# Altium schematic symbol library jlcpcb_2025_04_capacitors_extended_1206.schlib: 2503 symbols (part 5 of 14) (continued)
## C3216X5R1C476MTJ00N
designator C?  Capacitance: 47uF  (hidden comment: *)
Capacitor, Ceramic (MLCC), 47uF, ±20%, 16V, X5R, ±20%, SMD 1206; Manufacturer: TDK; Manufacturer Part Number: C3216X5R1C476MTJ00N; Package Size: 1206; JLCPCB Basic Part: No; JLCPCB Part Number: C338051; Supplier 1: LCSC; Category: Capacitors - MLCC; Supplier Part Number 1: C338051; Tolerance: ±20%; Voltage Rating: 16V; Temperature Coefficient: X5R; RoHS: Yes; ComponentLink1Description: Datasheet; ComponentLink1URL: https://wmsc.lcsc.com/wmsc/upload/file/pdf/v2/lcsc/2304140030_TDK-C3216X5R1C476MTJ00N_C338051.pdf; ComponentLink2Description: JLCPCB Part URL; ComponentLink2URL: https://jlcpcb.com/partdetail/C338051; ComponentLink3Description: LCSC Part URL; ComponentLink3URL: https://lcsc.com/product-detail/Multilayer-Ceramic-Capacitors-MLCC---SMD-SMT_TDK-TDK-C3216X5R1C476MTJ00N_C338051.html
footprint CAP-1206 (1206 (3216M) Capacitor)
pins: 1, 2

## C3216X5R1E106KT000E
designator C?  Capacitance: 10uF  (hidden comment: *)
Capacitor, Ceramic (MLCC), 10uF, ±10%, 25V, X5R, ±10%, SMD 1206; Manufacturer: TDK; Manufacturer Part Number: C3216X5R1E106KT000E; Package Size: 1206; JLCPCB Basic Part: No; JLCPCB Part Number: C329929; Supplier 1: LCSC; Category: Capacitors - MLCC; Supplier Part Number 1: C329929; Tolerance: ±10%; Voltage Rating: 25V; Temperature Coefficient: X5R; RoHS: Yes; ComponentLink1Description: Datasheet; ComponentLink1URL: https://wmsc.lcsc.com/wmsc/upload/file/pdf/v2/lcsc/2304140030_TDK-C3216X5R1E106KT000E_C329929.pdf; ComponentLink2Description: JLCPCB Part URL; ComponentLink2URL: https://jlcpcb.com/partdetail/C329929; ComponentLink3Description: LCSC Part URL; ComponentLink3URL: https://lcsc.com/product-detail/Multilayer-Ceramic-Capacitors-MLCC---SMD-SMT_TDK-TDK-C3216X5R1E106KT000E_C329929.html
footprint CAP-1206 (1206 (3216M) Capacitor)
pins: 1, 2

## C3216X5R1E106MT000N
designator C?  Capacitance: 10uF  (hidden comment: *)
Capacitor, Ceramic (MLCC), 10uF, ±20%, 25V, X5R, ±20%, SMD 1206; Manufacturer: TDK; Manufacturer Part Number: C3216X5R1E106MT000N; Package Size: 1206; JLCPCB Basic Part: No; JLCPCB Part Number: C342843; Supplier 1: LCSC; Category: Capacitors - MLCC; Supplier Part Number 1: C342843; Tolerance: ±20%; Voltage Rating: 25V; Temperature Coefficient: X5R; RoHS: Yes; ComponentLink1Description: Datasheet; ComponentLink1URL: https://wmsc.lcsc.com/wmsc/upload/file/pdf/v2/lcsc/2304140030_TDK-C3216X5R1E106MT000N_C342843.pdf; ComponentLink2Description: JLCPCB Part URL; ComponentLink2URL: https://jlcpcb.com/partdetail/C342843; ComponentLink3Description: LCSC Part URL; ComponentLink3URL: https://lcsc.com/product-detail/Multilayer-Ceramic-Capacitors-MLCC---SMD-SMT_TDK-TDK-C3216X5R1E106MT000N_C342843.html
footprint CAP-1206 (1206 (3216M) Capacitor)
pins: 1, 2

## C3216X5R1E226KTJ00N
designator C?  Capacitance: 22uF  (hidden comment: *)
Capacitor, Ceramic (MLCC), 22uF, ±10%, 25V, X5R, ±10%, SMD 1206; Manufacturer: TDK; Manufacturer Part Number: C3216X5R1E226KTJ00N; Package Size: 1206; JLCPCB Basic Part: No; JLCPCB Part Number: C338055; Supplier 1: LCSC; Category: Capacitors - MLCC; Supplier Part Number 1: C338055; Tolerance: ±10%; Voltage Rating: 25V; Temperature Coefficient: X5R; RoHS: Yes; ComponentLink1Description: Datasheet; ComponentLink1URL: https://wmsc.lcsc.com/wmsc/upload/file/pdf/v2/lcsc/2304140030_TDK-C3216X5R1E226KTJ00N_C338055.pdf; ComponentLink2Description: JLCPCB Part URL; ComponentLink2URL: https://jlcpcb.com/partdetail/C338055; ComponentLink3Description: LCSC Part URL; ComponentLink3URL: https://lcsc.com/product-detail/Multilayer-Ceramic-Capacitors-MLCC---SMD-SMT_TDK-TDK-C3216X5R1E226KTJ00N_C338055.html
footprint CAP-1206 (1206 (3216M) Capacitor)
pins: 1, 2

## C3216X5R1E226MTJ00N
designator C?  Capacitance: 22uF  (hidden comment: *)
Capacitor, Ceramic (MLCC), 22uF, ±20%, 25V, X5R, ±20%, SMD 1206; Manufacturer: TDK; Manufacturer Part Number: C3216X5R1E226MTJ00N; Package Size: 1206; JLCPCB Basic Part: No; JLCPCB Part Number: C361176; Supplier 1: LCSC; Category: Capacitors - MLCC; Supplier Part Number 1: C361176; Tolerance: ±20%; Voltage Rating: 25V; Temperature Coefficient: X5R; RoHS: Yes; ComponentLink1Description: Datasheet; ComponentLink1URL: https://wmsc.lcsc.com/wmsc/upload/file/pdf/v2/lcsc/2304140030_TDK-C3216X5R1E226MTJ00N_C361176.pdf; ComponentLink2Description: JLCPCB Part URL; ComponentLink2URL: https://jlcpcb.com/partdetail/C361176; ComponentLink3Description: LCSC Part URL; ComponentLink3URL: https://lcsc.com/product-detail/Multilayer-Ceramic-Capacitors-MLCC---SMD-SMT_TDK-TDK-C3216X5R1E226MTJ00N_C361176.html
footprint CAP-1206 (1206 (3216M) Capacitor)
pins: 1, 2

## C3216X5R1E336MT000E
designator C?  Capacitance: 33uF  (hidden comment: *)
Capacitor, Ceramic (MLCC), 33uF, ±20%, 25V, X5R, ±20%, SMD 1206; Manufacturer: TDK; Manufacturer Part Number: C3216X5R1E336MT000E; Package Size: 1206; JLCPCB Basic Part: No; JLCPCB Part Number: C342307; Supplier 1: LCSC; Category: Capacitors - MLCC; Supplier Part Number 1: C342307; Tolerance: ±20%; Voltage Rating: 25V; Temperature Coefficient: X5R; RoHS: Yes; ComponentLink1Description: Datasheet; ComponentLink1URL: https://wmsc.lcsc.com/wmsc/upload/file/pdf/v2/lcsc/2304140030_TDK-C3216X5R1E336MT000E_C342307.pdf; ComponentLink2Description: JLCPCB Part URL; ComponentLink2URL: https://jlcpcb.com/partdetail/C342307; ComponentLink3Description: LCSC Part URL; ComponentLink3URL: https://lcsc.com/product-detail/Multilayer-Ceramic-Capacitors-MLCC---SMD-SMT_TDK-TDK-C3216X5R1E336MT000E_C342307.html
footprint CAP-1206 (1206 (3216M) Capacitor)
pins: 1, 2

## C3216X5R1E475KT000N
designator C?  Capacitance: 4.7uF  (hidden comment: *)
Capacitor, Ceramic (MLCC), 4.7uF, ±10%, 25V, X5R, ±10%, SMD 1206; Manufacturer: TDK; Manufacturer Part Number: C3216X5R1E475KT000N; Package Size: 1206; JLCPCB Basic Part: No; JLCPCB Part Number: C338009; Supplier 1: LCSC; Category: Capacitors - MLCC; Supplier Part Number 1: C338009; Tolerance: ±10%; Voltage Rating: 25V; Temperature Coefficient: X5R; RoHS: Yes; ComponentLink1Description: Datasheet; ComponentLink1URL: https://wmsc.lcsc.com/wmsc/upload/file/pdf/v2/lcsc/2304140030_TDK-C3216X5R1E475KT000N_C338009.pdf; ComponentLink2Description: JLCPCB Part URL; ComponentLink2URL: https://jlcpcb.com/partdetail/C338009; ComponentLink3Description: LCSC Part URL; ComponentLink3URL: https://lcsc.com/product-detail/Multilayer-Ceramic-Capacitors-MLCC---SMD-SMT_TDK-TDK-C3216X5R1E475KT000N_C338009.html
footprint CAP-1206 (1206 (3216M) Capacitor)
pins: 1, 2

## C3216X5R1E476MTJ00E
designator C?  Capacitance: 47uF  (hidden comment: *)
Capacitor, Ceramic (MLCC), 47uF, ±20%, 25V, X5R, ±20%, SMD 1206; Manufacturer: TDK; Manufacturer Part Number: C3216X5R1E476MTJ00E; Package Size: 1206; JLCPCB Basic Part: No; JLCPCB Part Number: C76659; Supplier 1: LCSC; Category: Capacitors - MLCC; Supplier Part Number 1: C76659; Tolerance: ±20%; Voltage Rating: 25V; Temperature Coefficient: X5R; RoHS: Yes; ComponentLink1Description: Datasheet; ComponentLink1URL: https://wmsc.lcsc.com/wmsc/upload/file/pdf/v2/lcsc/2304140030_TDK-C3216X5R1E476MTJ00E_C76659.pdf; ComponentLink2Description: JLCPCB Part URL; ComponentLink2URL: https://jlcpcb.com/partdetail/C76659; ComponentLink3Description: LCSC Part URL; ComponentLink3URL: https://lcsc.com/product-detail/Multilayer-Ceramic-Capacitors-MLCC---SMD-SMT_TDK-TDK-C3216X5R1E476MTJ00E_C76659.html
footprint CAP-1206 (1206 (3216M) Capacitor)
pins: 1, 2

## C3216X5R1H106KT000N
designator C?  Capacitance: 10uF  (hidden comment: *)
Capacitor, Ceramic (MLCC), 10uF, ±10%, 50V, X5R, ±10%, SMD 1206; Manufacturer: TDK; Manufacturer Part Number: C3216X5R1H106KT000N; Package Size: 1206; JLCPCB Basic Part: No; JLCPCB Part Number: C329928; Supplier 1: LCSC; Category: Capacitors - MLCC; Supplier Part Number 1: C329928; Tolerance: ±10%; Voltage Rating: 50V; Temperature Coefficient: X5R; RoHS: Yes; ComponentLink1Description: Datasheet; ComponentLink1URL: https://wmsc.lcsc.com/wmsc/upload/file/pdf/v2/lcsc/2304140030_TDK-C3216X5R1H106KT000N_C329928.pdf; ComponentLink2Description: JLCPCB Part URL; ComponentLink2URL: https://jlcpcb.com/partdetail/C329928; ComponentLink3Description: LCSC Part URL; ComponentLink3URL: https://lcsc.com/product-detail/Multilayer-Ceramic-Capacitors-MLCC---SMD-SMT_TDK-TDK-C3216X5R1H106KT000N_C329928.html
footprint CAP-1206 (1206 (3216M) Capacitor)
pins: 1, 2

## C3216X5R1H475KT0J5N
designator C?  Capacitance: 4.7uF  (hidden comment: *)
Capacitor, Ceramic (MLCC), 4.7uF, ±10%, 50V, X5R, ±10%, SMD 1206; Manufacturer: TDK; Manufacturer Part Number: C3216X5R1H475KT0J5N; Package Size: 1206; JLCPCB Basic Part: No; JLCPCB Part Number: C695152; Supplier 1: LCSC; Category: Capacitors - MLCC; Supplier Part Number 1: C695152; Tolerance: ±10%; Voltage Rating: 50V; Temperature Coefficient: X5R; RoHS: Yes; ComponentLink1Description: Datasheet; ComponentLink1URL: https://wmsc.lcsc.com/wmsc/upload/file/pdf/v2/lcsc/2304140030_TDK-C3216X5R1H475KT0J5N_C695152.pdf; ComponentLink2Description: JLCPCB Part URL; ComponentLink2URL: https://jlcpcb.com/partdetail/C695152; ComponentLink3Description: LCSC Part URL; ComponentLink3URL: https://lcsc.com/product-detail/Multilayer-Ceramic-Capacitors-MLCC---SMD-SMT_TDK-TDK-C3216X5R1H475KT0J5N_C695152.html
footprint CAP-1206 (1206 (3216M) Capacitor)
pins: 1, 2

## C3216X5R1H685KT000N
designator C?  Capacitance: 6.8uF  (hidden comment: *)
Capacitor, Ceramic (MLCC), 6.8uF, ±10%, 50V, X5R, ±10%, SMD 1206; Manufacturer: TDK; Manufacturer Part Number: C3216X5R1H685KT000N; Package Size: 1206; JLCPCB Basic Part: No; JLCPCB Part Number: C342643; Supplier 1: LCSC; Category: Capacitors - MLCC; Supplier Part Number 1: C342643; Tolerance: ±10%; Voltage Rating: 50V; Temperature Coefficient: X5R; RoHS: Yes; ComponentLink1Description: Datasheet; ComponentLink1URL: https://wmsc.lcsc.com/wmsc/upload/file/pdf/v2/lcsc/2304140030_TDK-C3216X5R1H685KT000N_C342643.pdf; ComponentLink2Description: JLCPCB Part URL; ComponentLink2URL: https://jlcpcb.com/partdetail/C342643; ComponentLink3Description: LCSC Part URL; ComponentLink3URL: https://lcsc.com/product-detail/Multilayer-Ceramic-Capacitors-MLCC---SMD-SMT_TDK-TDK-C3216X5R1H685KT000N_C342643.html
footprint CAP-1206 (1206 (3216M) Capacitor)
pins: 1, 2

## C3216X5R1V226MTJ00E
designator C?  Capacitance: 22uF  (hidden comment: *)
Capacitor, Ceramic (MLCC), 22uF, ±20%, 35V, X5R, ±20%, SMD 1206; Manufacturer: TDK; Manufacturer Part Number: C3216X5R1V226MTJ00E; Package Size: 1206; JLCPCB Basic Part: No; JLCPCB Part Number: C342620; Supplier 1: LCSC; Category: Capacitors - MLCC; Supplier Part Number 1: C342620; Tolerance: ±20%; Voltage Rating: 35V; Temperature Coefficient: X5R; RoHS: Yes; ComponentLink1Description: Datasheet; ComponentLink1URL: https://wmsc.lcsc.com/wmsc/upload/file/pdf/v2/lcsc/2304140030_TDK-C3216X5R1V226MTJ00E_C342620.pdf; ComponentLink2Description: JLCPCB Part URL; ComponentLink2URL: https://jlcpcb.com/partdetail/C342620; ComponentLink3Description: LCSC Part URL; ComponentLink3URL: https://lcsc.com/product-detail/Multilayer-Ceramic-Capacitors-MLCC---SMD-SMT_TDK-TDK-C3216X5R1V226MTJ00E_C342620.html
footprint CAP-1206 (1206 (3216M) Capacitor)
pins: 1, 2

## C3216X6S0J476MTJ00N
designator C?  Capacitance: 47uF  (hidden comment: *)
Capacitor, Ceramic (MLCC), 47uF, ±20%, 6.3V, X6S, ±20%, SMD 1206; Manufacturer: TDK; Manufacturer Part Number: C3216X6S0J476MTJ00N; Package Size: 1206; JLCPCB Basic Part: No; JLCPCB Part Number: C342598; Supplier 1: LCSC; Category: Capacitors - MLCC; Supplier Part Number 1: C342598; Tolerance: ±20%; Voltage Rating: 6.3V; Temperature Coefficient: X6S; RoHS: Yes; ComponentLink1Description: Datasheet; ComponentLink1URL: https://wmsc.lcsc.com/wmsc/upload/file/pdf/v2/lcsc/2304140030_TDK-C3216X6S0J476MTJ00N_C342598.pdf; ComponentLink2Description: JLCPCB Part URL; ComponentLink2URL: https://jlcpcb.com/partdetail/C342598; ComponentLink3Description: LCSC Part URL; ComponentLink3URL: https://lcsc.com/product-detail/Multilayer-Ceramic-Capacitors-MLCC---SMD-SMT_TDK-TDK-C3216X6S0J476MTJ00N_C342598.html
footprint CAP-1206 (1206 (3216M) Capacitor)
pins: 1, 2

## C3216X6S1A476MTJ00E
designator C?  Capacitance: 47uF  (hidden comment: *)
Capacitor, Ceramic (MLCC), 47uF, ±20%, 10V, X6S, ±20%, SMD 1206; Manufacturer: TDK; Manufacturer Part Number: C3216X6S1A476MTJ00E; Package Size: 1206; JLCPCB Basic Part: No; JLCPCB Part Number: C432922; Supplier 1: LCSC; Category: Capacitors - MLCC; Supplier Part Number 1: C432922; Tolerance: ±20%; Voltage Rating: 10V; Temperature Coefficient: X6S; RoHS: Yes; ComponentLink1Description: Datasheet; ComponentLink1URL: https://wmsc.lcsc.com/wmsc/upload/file/pdf/v2/lcsc/2304140030_TDK-C3216X6S1A476MTJ00E_C432922.pdf; ComponentLink2Description: JLCPCB Part URL; ComponentLink2URL: https://jlcpcb.com/partdetail/C432922; ComponentLink3Description: LCSC Part URL; ComponentLink3URL: https://lcsc.com/product-detail/Multilayer-Ceramic-Capacitors-MLCC---SMD-SMT_TDK-TDK-C3216X6S1A476MTJ00E_C432922.html
footprint CAP-1206 (1206 (3216M) Capacitor)
pins: 1, 2

## C3216X6S1C226MTJ00E
designator C?  Capacitance: 22uF  (hidden comment: *)
Capacitor, Ceramic (MLCC), 22uF, ±20%, 16V, X6S, ±20%, SMD 1206; Manufacturer: TDK; Manufacturer Part Number: C3216X6S1C226MTJ00E; Package Size: 1206; JLCPCB Basic Part: No; JLCPCB Part Number: C342622; Supplier 1: LCSC; Category: Capacitors - MLCC; Supplier Part Number 1: C342622; Tolerance: ±20%; Voltage Rating: 16V; Temperature Coefficient: X6S; RoHS: Yes; ComponentLink1Description: Datasheet; ComponentLink1URL: https://wmsc.lcsc.com/wmsc/upload/file/pdf/v2/lcsc/2304140030_TDK-C3216X6S1C226MTJ00E_C342622.pdf; ComponentLink2Description: JLCPCB Part URL; ComponentLink2URL: https://jlcpcb.com/partdetail/C342622; ComponentLink3Description: LCSC Part URL; ComponentLink3URL: https://lcsc.com/product-detail/Multilayer-Ceramic-Capacitors-MLCC---SMD-SMT_TDK-TDK-C3216X6S1C226MTJ00E_C342622.html
footprint CAP-1206 (1206 (3216M) Capacitor)
pins: 1, 2

## C3216X7R1C106KT000N
designator C?  Capacitance: 10uF  (hidden comment: *)
Capacitor, Ceramic (MLCC), 10uF, ±10%, 16V, X7R, ±10%, SMD 1206; Manufacturer: TDK; Manufacturer Part Number: C3216X7R1C106KT000N; Package Size: 1206; JLCPCB Basic Part: No; JLCPCB Part Number: C342827; Supplier 1: LCSC; Category: Capacitors - MLCC; Supplier Part Number 1: C342827; Tolerance: ±10%; Voltage Rating: 16V; Temperature Coefficient: X7R; RoHS: Yes; ComponentLink1Description: Datasheet; ComponentLink1URL: https://wmsc.lcsc.com/wmsc/upload/file/pdf/v2/lcsc/2304140030_TDK-C3216X7R1C106KT000N_C342827.pdf; ComponentLink2Description: JLCPCB Part URL; ComponentLink2URL: https://jlcpcb.com/partdetail/C342827; ComponentLink3Description: LCSC Part URL; ComponentLink3URL: https://lcsc.com/product-detail/Multilayer-Ceramic-Capacitors-MLCC---SMD-SMT_TDK-TDK-C3216X7R1C106KT000N_C342827.html
footprint CAP-1206 (1206 (3216M) Capacitor)
pins: 1, 2

## C3216X7R1C106MT000N
designator C?  Capacitance: 10uF  (hidden comment: *)
Capacitor, Ceramic (MLCC), 10uF, ±20%, 16V, X7R, ±20%, SMD 1206; Manufacturer: TDK; Manufacturer Part Number: C3216X7R1C106MT000N; Package Size: 1206; JLCPCB Basic Part: No; JLCPCB Part Number: C342828; Supplier 1: LCSC; Category: Capacitors - MLCC; Supplier Part Number 1: C342828; Tolerance: ±20%; Voltage Rating: 16V; Temperature Coefficient: X7R; RoHS: Yes; ComponentLink1Description: Datasheet; ComponentLink1URL: https://wmsc.lcsc.com/wmsc/upload/file/pdf/v2/lcsc/2304140030_TDK-C3216X7R1C106MT000N_C342828.pdf; ComponentLink2Description: JLCPCB Part URL; ComponentLink2URL: https://jlcpcb.com/partdetail/C342828; ComponentLink3Description: LCSC Part URL; ComponentLink3URL: https://lcsc.com/product-detail/Multilayer-Ceramic-Capacitors-MLCC---SMD-SMT_TDK-TDK-C3216X7R1C106MT000N_C342828.html
footprint CAP-1206 (1206 (3216M) Capacitor)
pins: 1, 2

## C3216X7R1C335KT000N
designator C?  Capacitance: 3.3uF  (hidden comment: *)
Capacitor, Ceramic (MLCC), 3.3uF, ±10%, 16V, X7R, ±10%, SMD 1206; Manufacturer: TDK; Manufacturer Part Number: C3216X7R1C335KT000N; Package Size: 1206; JLCPCB Basic Part: No; JLCPCB Part Number: C694465; Supplier 1: LCSC; Category: Capacitors - MLCC; Supplier Part Number 1: C694465; Tolerance: ±10%; Voltage Rating: 16V; Temperature Coefficient: X7R; RoHS: Yes; ComponentLink1Description: Datasheet; ComponentLink1URL: https://wmsc.lcsc.com/wmsc/upload/file/pdf/v2/lcsc/2304140030_TDK-C3216X7R1C335KT000N_C694465.pdf; ComponentLink2Description: JLCPCB Part URL; ComponentLink2URL: https://jlcpcb.com/partdetail/C694465; ComponentLink3Description: LCSC Part URL; ComponentLink3URL: https://lcsc.com/product-detail/Multilayer-Ceramic-Capacitors-MLCC---SMD-SMT_TDK-TDK-C3216X7R1C335KT000N_C694465.html
footprint CAP-1206 (1206 (3216M) Capacitor)
pins: 1, 2

## C3216X7R1C475KT000N
designator C?  Capacitance: 4.7uF  (hidden comment: *)
Capacitor, Ceramic (MLCC), 4.7uF, ±10%, 16V, X7R, ±10%, SMD 1206; Manufacturer: TDK; Manufacturer Part Number: C3216X7R1C475KT000N; Package Size: 1206; JLCPCB Basic Part: No; JLCPCB Part Number: C695153; Supplier 1: LCSC; Category: Capacitors - MLCC; Supplier Part Number 1: C695153; Tolerance: ±10%; Voltage Rating: 16V; Temperature Coefficient: X7R; RoHS: Yes; ComponentLink1Description: Datasheet; ComponentLink1URL: https://wmsc.lcsc.com/wmsc/upload/file/pdf/v2/lcsc/2304140030_TDK-C3216X7R1C475KT000N_C695153.pdf; ComponentLink2Description: JLCPCB Part URL; ComponentLink2URL: https://jlcpcb.com/partdetail/C695153; ComponentLink3Description: LCSC Part URL; ComponentLink3URL: https://lcsc.com/product-detail/Multilayer-Ceramic-Capacitors-MLCC---SMD-SMT_TDK-TDK-C3216X7R1C475KT000N_C695153.html
footprint CAP-1206 (1206 (3216M) Capacitor)
pins: 1, 2

## C3216X7R1E105KT000N
designator C?  Capacitance: 1uF  (hidden comment: *)
Capacitor, Ceramic (MLCC), 1uF, ±10%, 25V, X7R, ±10%, SMD 1206; Manufacturer: TDK; Manufacturer Part Number: C3216X7R1E105KT000N; Package Size: 1206; JLCPCB Basic Part: No; JLCPCB Part Number: C76660; Supplier 1: LCSC; Category: Capacitors - MLCC; Supplier Part Number 1: C76660; Tolerance: ±10%; Voltage Rating: 25V; Temperature Coefficient: X7R; RoHS: Yes; ComponentLink1Description: Datasheet; ComponentLink1URL: https://wmsc.lcsc.com/wmsc/upload/file/pdf/v2/lcsc/2304140030_TDK-C3216X7R1E105KT000N_C76660.pdf; ComponentLink2Description: JLCPCB Part URL; ComponentLink2URL: https://jlcpcb.com/partdetail/C76660; ComponentLink3Description: LCSC Part URL; ComponentLink3URL: https://lcsc.com/product-detail/Multilayer-Ceramic-Capacitors-MLCC---SMD-SMT_TDK-TDK-C3216X7R1E105KT000N_C76660.html
footprint CAP-1206 (1206 (3216M) Capacitor)
pins: 1, 2

## C3216X7R1E106KT000N
designator C?  Capacitance: 10uF  (hidden comment: *)
Capacitor, Ceramic (MLCC), 10uF, ±10%, 25V, X7R, ±10%, SMD 1206; Manufacturer: TDK; Manufacturer Part Number: C3216X7R1E106KT000N; Package Size: 1206; JLCPCB Basic Part: No; JLCPCB Part Number: C76661; Supplier 1: LCSC; Category: Capacitors - MLCC; Supplier Part Number 1: C76661; Tolerance: ±10%; Voltage Rating: 25V; Temperature Coefficient: X7R; RoHS: Yes; ComponentLink1Description: Datasheet; ComponentLink1URL: https://wmsc.lcsc.com/wmsc/upload/file/pdf/v2/lcsc/2304140030_TDK-C3216X7R1E106KT000N_C76661.pdf; ComponentLink2Description: JLCPCB Part URL; ComponentLink2URL: https://jlcpcb.com/partdetail/C76661; ComponentLink3Description: LCSC Part URL; ComponentLink3URL: https://lcsc.com/product-detail/Multilayer-Ceramic-Capacitors-MLCC---SMD-SMT_TDK-TDK-C3216X7R1E106KT000N_C76661.html
footprint CAP-1206 (1206 (3216M) Capacitor)
pins: 1, 2

## C3216X7R1E155KT000N
designator C?  Capacitance: 1.5uF  (hidden comment: *)
Capacitor, Ceramic (MLCC), 1.5uF, ±10%, 25V, X7R, ±10%, SMD 1206; Manufacturer: TDK; Manufacturer Part Number: C3216X7R1E155KT000N; Package Size: 1206; JLCPCB Basic Part: No; JLCPCB Part Number: C76662; Supplier 1: LCSC; Category: Capacitors - MLCC; Supplier Part Number 1: C76662; Tolerance: ±10%; Voltage Rating: 25V; Temperature Coefficient: X7R; RoHS: Yes; ComponentLink1Description: Datasheet; ComponentLink1URL: https://wmsc.lcsc.com/wmsc/upload/file/pdf/v2/lcsc/2304140030_TDK-C3216X7R1E155KT000N_C76662.pdf; ComponentLink2Description: JLCPCB Part URL; ComponentLink2URL: https://jlcpcb.com/partdetail/C76662; ComponentLink3Description: LCSC Part URL; ComponentLink3URL: https://lcsc.com/product-detail/Multilayer-Ceramic-Capacitors-MLCC---SMD-SMT_TDK-TDK-C3216X7R1E155KT000N_C76662.html
footprint CAP-1206 (1206 (3216M) Capacitor)
pins: 1, 2

## C3216X7R1E225KT000N
designator C?  Capacitance: 2.2uF  (hidden comment: *)
Capacitor, Ceramic (MLCC), 2.2uF, ±10%, 25V, X7R, ±10%, SMD 1206; Manufacturer: TDK; Manufacturer Part Number: C3216X7R1E225KT000N; Package Size: 1206; JLCPCB Basic Part: No; JLCPCB Part Number: C329967; Supplier 1: LCSC; Category: Capacitors - MLCC; Supplier Part Number 1: C329967; Tolerance: ±10%; Voltage Rating: 25V; Temperature Coefficient: X7R; RoHS: Yes; ComponentLink1Description: Datasheet; ComponentLink1URL: https://wmsc.lcsc.com/wmsc/upload/file/pdf/v2/lcsc/2304140030_TDK-C3216X7R1E225KT000N_C329967.pdf; ComponentLink2Description: JLCPCB Part URL; ComponentLink2URL: https://jlcpcb.com/partdetail/C329967; ComponentLink3Description: LCSC Part URL; ComponentLink3URL: https://lcsc.com/product-detail/Multilayer-Ceramic-Capacitors-MLCC---SMD-SMT_TDK-TDK-C3216X7R1E225KT000N_C329967.html
footprint CAP-1206 (1206 (3216M) Capacitor)
pins: 1, 2

## C3216X7R1E335KT000N
designator C?  Capacitance: 3.3uF  (hidden comment: *)
Capacitor, Ceramic (MLCC), 3.3uF, ±10%, 25V, X7R, ±10%, SMD 1206; Manufacturer: TDK; Manufacturer Part Number: C3216X7R1E335KT000N; Package Size: 1206; JLCPCB Basic Part: No; JLCPCB Part Number: C76663; Supplier 1: LCSC; Category: Capacitors - MLCC; Supplier Part Number 1: C76663; Tolerance: ±10%; Voltage Rating: 25V; Temperature Coefficient: X7R; RoHS: Yes; ComponentLink1Description: Datasheet; ComponentLink1URL: https://wmsc.lcsc.com/wmsc/upload/file/pdf/v2/lcsc/2304140030_TDK-C3216X7R1E335KT000N_C76663.pdf; ComponentLink2Description: JLCPCB Part URL; ComponentLink2URL: https://jlcpcb.com/partdetail/C76663; ComponentLink3Description: LCSC Part URL; ComponentLink3URL: https://lcsc.com/product-detail/Multilayer-Ceramic-Capacitors-MLCC---SMD-SMT_TDK-TDK-C3216X7R1E335KT000N_C76663.html
footprint CAP-1206 (1206 (3216M) Capacitor)
pins: 1, 2

## C3216X7R1E475KT000N
designator C?  Capacitance: 4.7uF  (hidden comment: *)
Capacitor, Ceramic (MLCC), 4.7uF, ±10%, 25V, X7R, ±10%, SMD 1206; Manufacturer: TDK; Manufacturer Part Number: C3216X7R1E475KT000N; Package Size: 1206; JLCPCB Basic Part: No; JLCPCB Part Number: C363926; Supplier 1: LCSC; Category: Capacitors - MLCC; Supplier Part Number 1: C363926; Tolerance: ±10%; Voltage Rating: 25V; Temperature Coefficient: X7R; RoHS: Yes; ComponentLink1Description: Datasheet; ComponentLink1URL: https://wmsc.lcsc.com/wmsc/upload/file/pdf/v2/lcsc/1912111437_TDK-C3216X7R1E475KT000N_C363926.pdf; ComponentLink2Description: JLCPCB Part URL; ComponentLink2URL: https://jlcpcb.com/partdetail/C363926; ComponentLink3Description: LCSC Part URL; ComponentLink3URL: https://lcsc.com/product-detail/Multilayer-Ceramic-Capacitors-MLCC---SMD-SMT_TDK-TDK-C3216X7R1E475KT000N_C363926.html
footprint CAP-1206 (1206 (3216M) Capacitor)
pins: 1, 2

## C3216X7R1H104KT000N
designator C?  Capacitance: 100nF  (hidden comment: *)
Capacitor, Ceramic (MLCC), 100nF, ±10%, 50V, X7R, ±10%, SMD 1206; Manufacturer: TDK; Manufacturer Part Number: C3216X7R1H104KT000N; Package Size: 1206; JLCPCB Basic Part: No; JLCPCB Part Number: C695154; Supplier 1: LCSC; Category: Capacitors - MLCC; Supplier Part Number 1: C695154; Tolerance: ±10%; Voltage Rating: 50V; Temperature Coefficient: X7R; RoHS: Yes; ComponentLink1Description: Datasheet; ComponentLink1URL: https://wmsc.lcsc.com/wmsc/upload/file/pdf/v2/lcsc/2304140030_TDK-C3216X7R1H104KT000N_C695154.pdf; ComponentLink2Description: JLCPCB Part URL; ComponentLink2URL: https://jlcpcb.com/partdetail/C695154; ComponentLink3Description: LCSC Part URL; ComponentLink3URL: https://lcsc.com/product-detail/Multilayer-Ceramic-Capacitors-MLCC---SMD-SMT_TDK-TDK-C3216X7R1H104KT000N_C695154.html
footprint CAP-1206 (1206 (3216M) Capacitor)
pins: 1, 2

## C3216X7R1H105KT000N
designator C?  Capacitance: 1uF  (hidden comment: *)
Capacitor, Ceramic (MLCC), 1uF, ±10%, 50V, X7R, ±10%, SMD 1206; Manufacturer: TDK; Manufacturer Part Number: C3216X7R1H105KT000N; Package Size: 1206; JLCPCB Basic Part: No; JLCPCB Part Number: C329931; Supplier 1: LCSC; Category: Capacitors - MLCC; Supplier Part Number 1: C329931; Tolerance: ±10%; Voltage Rating: 50V; Temperature Coefficient: X7R; RoHS: Yes; ComponentLink1Description: Datasheet; ComponentLink1URL: https://wmsc.lcsc.com/wmsc/upload/file/pdf/v2/lcsc/2304140030_TDK-C3216X7R1H105KT000N_C329931.pdf; ComponentLink2Description: JLCPCB Part URL; ComponentLink2URL: https://jlcpcb.com/partdetail/C329931; ComponentLink3Description: LCSC Part URL; ComponentLink3URL: https://lcsc.com/product-detail/Multilayer-Ceramic-Capacitors-MLCC---SMD-SMT_TDK-TDK-C3216X7R1H105KT000N_C329931.html
footprint CAP-1206 (1206 (3216M) Capacitor)
pins: 1, 2

## C3216X7R1H106KT0A0E
designator C?  Capacitance: 10uF  (hidden comment: *)
Capacitor, Ceramic (MLCC), 10uF, ±10%, 50V, X7R, ±10%, SMD 1206; Manufacturer: TDK; Manufacturer Part Number: C3216X7R1H106KT0A0E; Package Size: 1206; JLCPCB Basic Part: No; JLCPCB Part Number: C694197; Supplier 1: LCSC; Category: Capacitors - MLCC; Supplier Part Number 1: C694197; Tolerance: ±10%; Voltage Rating: 50V; Temperature Coefficient: X7R; RoHS: Yes; ComponentLink1Description: Datasheet; ComponentLink1URL: https://wmsc.lcsc.com/wmsc/upload/file/pdf/v2/lcsc/2304140030_TDK-C3216X7R1H106KT0A0E_C694197.pdf; ComponentLink2Description: JLCPCB Part URL; ComponentLink2URL: https://jlcpcb.com/partdetail/C694197; ComponentLink3Description: LCSC Part URL; ComponentLink3URL: https://lcsc.com/product-detail/Multilayer-Ceramic-Capacitors-MLCC---SMD-SMT_TDK-TDK-C3216X7R1H106KT0A0E_C694197.html
footprint CAP-1206 (1206 (3216M) Capacitor)
pins: 1, 2

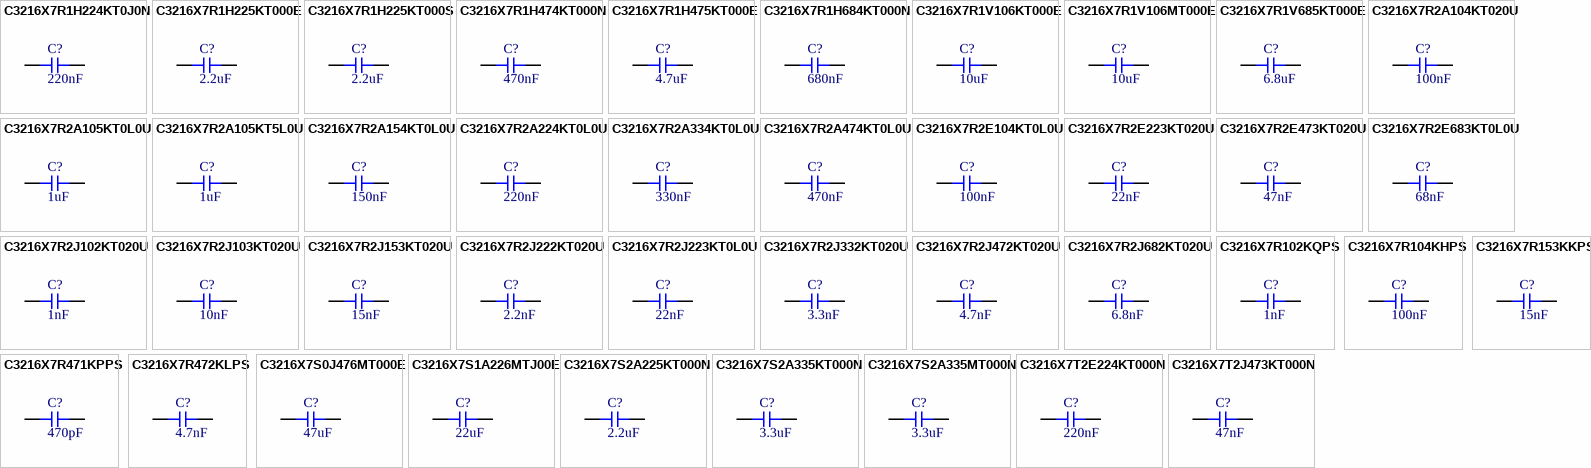
[diagram p22: symbols C3216X7R1H224KT0J0N to C3216X7T2J473KT000N]

## C3216X7R1H224KT0J0N
designator C?  Capacitance: 220nF  (hidden comment: *)
Capacitor, Ceramic (MLCC), 220nF, ±10%, 50V, X7R, ±10%, SMD 1206; Manufacturer: TDK; Manufacturer Part Number: C3216X7R1H224KT0J0N; Package Size: 1206; JLCPCB Basic Part: No; JLCPCB Part Number: C338029; Supplier 1: LCSC; Category: Capacitors - MLCC; Supplier Part Number 1: C338029; Tolerance: ±10%; Voltage Rating: 50V; Temperature Coefficient: X7R; RoHS: Yes; ComponentLink1Description: Datasheet; ComponentLink1URL: https://wmsc.lcsc.com/wmsc/upload/file/pdf/v2/lcsc/2304140030_TDK-C3216X7R1H224KT0J0N_C338029.pdf; ComponentLink2Description: JLCPCB Part URL; ComponentLink2URL: https://jlcpcb.com/partdetail/C338029; ComponentLink3Description: LCSC Part URL; ComponentLink3URL: https://lcsc.com/product-detail/Multilayer-Ceramic-Capacitors-MLCC---SMD-SMT_TDK-TDK-C3216X7R1H224KT0J0N_C338029.html
footprint CAP-1206 (1206 (3216M) Capacitor)
pins: 1, 2

## C3216X7R1H225KT000E
designator C?  Capacitance: 2.2uF  (hidden comment: *)
Capacitor, Ceramic (MLCC), 2.2uF, ±10%, 50V, X7R, ±10%, SMD 1206; Manufacturer: TDK; Manufacturer Part Number: C3216X7R1H225KT000E; Package Size: 1206; JLCPCB Basic Part: No; JLCPCB Part Number: C432924; Supplier 1: LCSC; Category: Capacitors - MLCC; Supplier Part Number 1: C432924; Tolerance: ±10%; Voltage Rating: 50V; Temperature Coefficient: X7R; RoHS: Yes; ComponentLink1Description: Datasheet; ComponentLink1URL: https://wmsc.lcsc.com/wmsc/upload/file/pdf/v2/lcsc/2304140030_TDK-C3216X7R1H225KT000E_C432924.pdf; ComponentLink2Description: JLCPCB Part URL; ComponentLink2URL: https://jlcpcb.com/partdetail/C432924; ComponentLink3Description: LCSC Part URL; ComponentLink3URL: https://lcsc.com/product-detail/Multilayer-Ceramic-Capacitors-MLCC---SMD-SMT_TDK-TDK-C3216X7R1H225KT000E_C432924.html
footprint CAP-1206 (1206 (3216M) Capacitor)
pins: 1, 2

## C3216X7R1H225KT000S
designator C?  Capacitance: 2.2uF  (hidden comment: *)
Capacitor, Ceramic (MLCC), 2.2uF, ±10%, 50V, X7R, ±10%, SMD 1206; Manufacturer: TDK; Manufacturer Part Number: C3216X7R1H225KT000S; Package Size: 1206; JLCPCB Basic Part: No; JLCPCB Part Number: C508860; Supplier 1: LCSC; Category: Capacitors - MLCC; Supplier Part Number 1: C508860; Tolerance: ±10%; Voltage Rating: 50V; Temperature Coefficient: X7R; RoHS: Yes; ComponentLink1Description: Datasheet; ComponentLink1URL: https://wmsc.lcsc.com/wmsc/upload/file/pdf/v2/lcsc/2304140030_TDK-C3216X7R1H225KT000S_C508860.pdf; ComponentLink2Description: JLCPCB Part URL; ComponentLink2URL: https://jlcpcb.com/partdetail/C508860; ComponentLink3Description: LCSC Part URL; ComponentLink3URL: https://lcsc.com/product-detail/Multilayer-Ceramic-Capacitors-MLCC---SMD-SMT_TDK-TDK-C3216X7R1H225KT000S_C508860.html
footprint CAP-1206 (1206 (3216M) Capacitor)
pins: 1, 2

## C3216X7R1H474KT000N
designator C?  Capacitance: 470nF  (hidden comment: *)
Capacitor, Ceramic (MLCC), 470nF, ±10%, 50V, X7R, ±10%, SMD 1206; Manufacturer: TDK; Manufacturer Part Number: C3216X7R1H474KT000N; Package Size: 1206; JLCPCB Basic Part: No; JLCPCB Part Number: C432925; Supplier 1: LCSC; Category: Capacitors - MLCC; Supplier Part Number 1: C432925; Tolerance: ±10%; Voltage Rating: 50V; Temperature Coefficient: X7R; RoHS: Yes; ComponentLink1Description: Datasheet; ComponentLink1URL: https://wmsc.lcsc.com/wmsc/upload/file/pdf/v2/lcsc/2304140030_TDK-C3216X7R1H474KT000N_C432925.pdf; ComponentLink2Description: JLCPCB Part URL; ComponentLink2URL: https://jlcpcb.com/partdetail/C432925; ComponentLink3Description: LCSC Part URL; ComponentLink3URL: https://lcsc.com/product-detail/Multilayer-Ceramic-Capacitors-MLCC---SMD-SMT_TDK-TDK-C3216X7R1H474KT000N_C432925.html
footprint CAP-1206 (1206 (3216M) Capacitor)
pins: 1, 2

## C3216X7R1H475KT000E
designator C?  Capacitance: 4.7uF  (hidden comment: *)
Capacitor, Ceramic (MLCC), 4.7uF, ±10%, 50V, X7R, ±10%, SMD 1206; Manufacturer: TDK; Manufacturer Part Number: C3216X7R1H475KT000E; Package Size: 1206; JLCPCB Basic Part: No; JLCPCB Part Number: C342691; Supplier 1: LCSC; Category: Capacitors - MLCC; Supplier Part Number 1: C342691; Tolerance: ±10%; Voltage Rating: 50V; Temperature Coefficient: X7R; RoHS: Yes; ComponentLink1Description: Datasheet; ComponentLink1URL: https://wmsc.lcsc.com/wmsc/upload/file/pdf/v2/lcsc/2304140030_TDK-C3216X7R1H475KT000E_C342691.pdf; ComponentLink2Description: JLCPCB Part URL; ComponentLink2URL: https://jlcpcb.com/partdetail/C342691; ComponentLink3Description: LCSC Part URL; ComponentLink3URL: https://lcsc.com/product-detail/Multilayer-Ceramic-Capacitors-MLCC---SMD-SMT_TDK-TDK-C3216X7R1H475KT000E_C342691.html
footprint CAP-1206 (1206 (3216M) Capacitor)
pins: 1, 2

## C3216X7R1H684KT000N
designator C?  Capacitance: 680nF  (hidden comment: *)
Capacitor, Ceramic (MLCC), 680nF, ±10%, 50V, X7R, ±10%, SMD 1206; Manufacturer: TDK; Manufacturer Part Number: C3216X7R1H684KT000N; Package Size: 1206; JLCPCB Basic Part: No; JLCPCB Part Number: C695155; Supplier 1: LCSC; Category: Capacitors - MLCC; Supplier Part Number 1: C695155; Tolerance: ±10%; Voltage Rating: 50V; Temperature Coefficient: X7R; RoHS: Yes; ComponentLink1Description: Datasheet; ComponentLink1URL: https://wmsc.lcsc.com/wmsc/upload/file/pdf/v2/lcsc/2304140030_TDK-C3216X7R1H684KT000N_C695155.pdf; ComponentLink2Description: JLCPCB Part URL; ComponentLink2URL: https://jlcpcb.com/partdetail/C695155; ComponentLink3Description: LCSC Part URL; ComponentLink3URL: https://lcsc.com/product-detail/Multilayer-Ceramic-Capacitors-MLCC---SMD-SMT_TDK-TDK-C3216X7R1H684KT000N_C695155.html
footprint CAP-1206 (1206 (3216M) Capacitor)
pins: 1, 2

## C3216X7R1V106KT000E
designator C?  Capacitance: 10uF  (hidden comment: *)
Capacitor, Ceramic (MLCC), 10uF, ±10%, 35V, X7R, ±10%, SMD 1206; Manufacturer: TDK; Manufacturer Part Number: C3216X7R1V106KT000E; Package Size: 1206; JLCPCB Basic Part: No; JLCPCB Part Number: C76666; Supplier 1: LCSC; Category: Capacitors - MLCC; Supplier Part Number 1: C76666; Tolerance: ±10%; Voltage Rating: 35V; Temperature Coefficient: X7R; RoHS: Yes; ComponentLink1Description: Datasheet; ComponentLink1URL: https://wmsc.lcsc.com/wmsc/upload/file/pdf/v2/lcsc/2304140030_TDK-C3216X7R1V106KT000E_C76666.pdf; ComponentLink2Description: JLCPCB Part URL; ComponentLink2URL: https://jlcpcb.com/partdetail/C76666; ComponentLink3Description: LCSC Part URL; ComponentLink3URL: https://lcsc.com/product-detail/Multilayer-Ceramic-Capacitors-MLCC---SMD-SMT_TDK-TDK-C3216X7R1V106KT000E_C76666.html
footprint CAP-1206 (1206 (3216M) Capacitor)
pins: 1, 2

## C3216X7R1V106MT000E
designator C?  Capacitance: 10uF  (hidden comment: *)
Capacitor, Ceramic (MLCC), 10uF, ±20%, 35V, X7R, ±20%, SMD 1206; Manufacturer: TDK; Manufacturer Part Number: C3216X7R1V106MT000E; Package Size: 1206; JLCPCB Basic Part: No; JLCPCB Part Number: C361179; Supplier 1: LCSC; Category: Capacitors - MLCC; Supplier Part Number 1: C361179; Tolerance: ±20%; Voltage Rating: 35V; Temperature Coefficient: X7R; RoHS: Yes; ComponentLink1Description: Datasheet; ComponentLink1URL: https://wmsc.lcsc.com/wmsc/upload/file/pdf/v2/lcsc/2304140030_TDK-C3216X7R1V106MT000E_C361179.pdf; ComponentLink2Description: JLCPCB Part URL; ComponentLink2URL: https://jlcpcb.com/partdetail/C361179; ComponentLink3Description: LCSC Part URL; ComponentLink3URL: https://lcsc.com/product-detail/Multilayer-Ceramic-Capacitors-MLCC---SMD-SMT_TDK-TDK-C3216X7R1V106MT000E_C361179.html
footprint CAP-1206 (1206 (3216M) Capacitor)
pins: 1, 2

## C3216X7R1V685KT000E
designator C?  Capacitance: 6.8uF  (hidden comment: *)
Capacitor, Ceramic (MLCC), 6.8uF, ±10%, 35V, X7R, ±10%, SMD 1206; Manufacturer: TDK; Manufacturer Part Number: C3216X7R1V685KT000E; Package Size: 1206; JLCPCB Basic Part: No; JLCPCB Part Number: C342646; Supplier 1: LCSC; Category: Capacitors - MLCC; Supplier Part Number 1: C342646; Tolerance: ±10%; Voltage Rating: 35V; Temperature Coefficient: X7R; RoHS: Yes; ComponentLink1Description: Datasheet; ComponentLink1URL: https://wmsc.lcsc.com/wmsc/upload/file/pdf/v2/lcsc/2304140030_TDK-C3216X7R1V685KT000E_C342646.pdf; ComponentLink2Description: JLCPCB Part URL; ComponentLink2URL: https://jlcpcb.com/partdetail/C342646; ComponentLink3Description: LCSC Part URL; ComponentLink3URL: https://lcsc.com/product-detail/Multilayer-Ceramic-Capacitors-MLCC---SMD-SMT_TDK-TDK-C3216X7R1V685KT000E_C342646.html
footprint CAP-1206 (1206 (3216M) Capacitor)
pins: 1, 2

## C3216X7R2A104KT020U
designator C?  Capacitance: 100nF  (hidden comment: *)
Capacitor, Ceramic (MLCC), 100nF, ±10%, 100V, X7R, ±10%, SMD 1206; Manufacturer: TDK; Manufacturer Part Number: C3216X7R2A104KT020U; Package Size: 1206; JLCPCB Basic Part: No; JLCPCB Part Number: C76667; Supplier 1: LCSC; Category: Capacitors - MLCC; Supplier Part Number 1: C76667; Tolerance: ±10%; Voltage Rating: 100V; Temperature Coefficient: X7R; RoHS: Yes; ComponentLink1Description: Datasheet; ComponentLink1URL: https://wmsc.lcsc.com/wmsc/upload/file/pdf/v2/lcsc/2304140030_TDK-C3216X7R2A104KT020U_C76667.pdf; ComponentLink2Description: JLCPCB Part URL; ComponentLink2URL: https://jlcpcb.com/partdetail/C76667; ComponentLink3Description: LCSC Part URL; ComponentLink3URL: https://lcsc.com/product-detail/Multilayer-Ceramic-Capacitors-MLCC---SMD-SMT_TDK-TDK-C3216X7R2A104KT020U_C76667.html
footprint CAP-1206 (1206 (3216M) Capacitor)
pins: 1, 2

## C3216X7R2A105KT0L0U
designator C?  Capacitance: 1uF  (hidden comment: *)
Capacitor, Ceramic (MLCC), 1uF, ±10%, 100V, X7R, ±10%, SMD 1206; Manufacturer: TDK; Manufacturer Part Number: C3216X7R2A105KT0L0U; Package Size: 1206; JLCPCB Basic Part: No; JLCPCB Part Number: C342763; Supplier 1: LCSC; Category: Capacitors - MLCC; Supplier Part Number 1: C342763; Tolerance: ±10%; Voltage Rating: 100V; Temperature Coefficient: X7R; RoHS: Yes; ComponentLink1Description: Datasheet; ComponentLink1URL: https://wmsc.lcsc.com/wmsc/upload/file/pdf/v2/lcsc/1912111437_TDK-C3216X7R2A105KT0L0U_C342763.pdf; ComponentLink2Description: JLCPCB Part URL; ComponentLink2URL: https://jlcpcb.com/partdetail/C342763; ComponentLink3Description: LCSC Part URL; ComponentLink3URL: https://lcsc.com/product-detail/Multilayer-Ceramic-Capacitors-MLCC---SMD-SMT_TDK-TDK-C3216X7R2A105KT0L0U_C342763.html
footprint CAP-1206 (1206 (3216M) Capacitor)
pins: 1, 2

## C3216X7R2A105KT5L0U
designator C?  Capacitance: 1uF  (hidden comment: *)
Capacitor, Ceramic (MLCC), 1uF, ±10%, 100V, X7R, ±10%, SMD 1206; Manufacturer: TDK; Manufacturer Part Number: C3216X7R2A105KT5L0U; Package Size: 1206; JLCPCB Basic Part: No; JLCPCB Part Number: C508861; Supplier 1: LCSC; Category: Capacitors - MLCC; Supplier Part Number 1: C508861; Tolerance: ±10%; Voltage Rating: 100V; Temperature Coefficient: X7R; RoHS: Yes; ComponentLink1Description: Datasheet; ComponentLink1URL: https://wmsc.lcsc.com/wmsc/upload/file/pdf/v2/lcsc/2304140030_TDK-C3216X7R2A105KT5L0U_C508861.pdf; ComponentLink2Description: JLCPCB Part URL; ComponentLink2URL: https://jlcpcb.com/partdetail/C508861; ComponentLink3Description: LCSC Part URL; ComponentLink3URL: https://lcsc.com/product-detail/Multilayer-Ceramic-Capacitors-MLCC---SMD-SMT_TDK-TDK-C3216X7R2A105KT5L0U_C508861.html
footprint CAP-1206 (1206 (3216M) Capacitor)
pins: 1, 2

## C3216X7R2A154KT0L0U
designator C?  Capacitance: 150nF  (hidden comment: *)
Capacitor, Ceramic (MLCC), 150nF, ±10%, 100V, X7R, ±10%, SMD 1206; Manufacturer: TDK; Manufacturer Part Number: C3216X7R2A154KT0L0U; Package Size: 1206; JLCPCB Basic Part: No; JLCPCB Part Number: C76669; Supplier 1: LCSC; Category: Capacitors - MLCC; Supplier Part Number 1: C76669; Tolerance: ±10%; Voltage Rating: 100V; Temperature Coefficient: X7R; RoHS: Yes; ComponentLink1Description: Datasheet; ComponentLink1URL: https://wmsc.lcsc.com/wmsc/upload/file/pdf/v2/lcsc/2304140030_TDK-C3216X7R2A154KT0L0U_C76669.pdf; ComponentLink2Description: JLCPCB Part URL; ComponentLink2URL: https://jlcpcb.com/partdetail/C76669; ComponentLink3Description: LCSC Part URL; ComponentLink3URL: https://lcsc.com/product-detail/Multilayer-Ceramic-Capacitors-MLCC---SMD-SMT_TDK-TDK-C3216X7R2A154KT0L0U_C76669.html
footprint CAP-1206 (1206 (3216M) Capacitor)
pins: 1, 2

## C3216X7R2A224KT0L0U
designator C?  Capacitance: 220nF  (hidden comment: *)
Capacitor, Ceramic (MLCC), 220nF, ±10%, 100V, X7R, ±10%, SMD 1206; Manufacturer: TDK; Manufacturer Part Number: C3216X7R2A224KT0L0U; Package Size: 1206; JLCPCB Basic Part: No; JLCPCB Part Number: C342861; Supplier 1: LCSC; Category: Capacitors - MLCC; Supplier Part Number 1: C342861; Tolerance: ±10%; Voltage Rating: 100V; Temperature Coefficient: X7R; RoHS: Yes; ComponentLink1Description: Datasheet; ComponentLink1URL: https://wmsc.lcsc.com/wmsc/upload/file/pdf/v2/lcsc/2304140030_TDK-C3216X7R2A224KT0L0U_C342861.pdf; ComponentLink2Description: JLCPCB Part URL; ComponentLink2URL: https://jlcpcb.com/partdetail/C342861; ComponentLink3Description: LCSC Part URL; ComponentLink3URL: https://lcsc.com/product-detail/Multilayer-Ceramic-Capacitors-MLCC---SMD-SMT_TDK-TDK-C3216X7R2A224KT0L0U_C342861.html
footprint CAP-1206 (1206 (3216M) Capacitor)
pins: 1, 2

## C3216X7R2A334KT0L0U
designator C?  Capacitance: 330nF  (hidden comment: *)
Capacitor, Ceramic (MLCC), 330nF, ±10%, 100V, X7R, ±10%, SMD 1206; Manufacturer: TDK; Manufacturer Part Number: C3216X7R2A334KT0L0U; Package Size: 1206; JLCPCB Basic Part: No; JLCPCB Part Number: C76670; Supplier 1: LCSC; Category: Capacitors - MLCC; Supplier Part Number 1: C76670; Tolerance: ±10%; Voltage Rating: 100V; Temperature Coefficient: X7R; RoHS: Yes; ComponentLink1Description: Datasheet; ComponentLink1URL: https://wmsc.lcsc.com/wmsc/upload/file/pdf/v2/lcsc/2304140030_TDK-C3216X7R2A334KT0L0U_C76670.pdf; ComponentLink2Description: JLCPCB Part URL; ComponentLink2URL: https://jlcpcb.com/partdetail/C76670; ComponentLink3Description: LCSC Part URL; ComponentLink3URL: https://lcsc.com/product-detail/Multilayer-Ceramic-Capacitors-MLCC---SMD-SMT_TDK-TDK-C3216X7R2A334KT0L0U_C76670.html
footprint CAP-1206 (1206 (3216M) Capacitor)
pins: 1, 2

## C3216X7R2A474KT0L0U
designator C?  Capacitance: 470nF  (hidden comment: *)
Capacitor, Ceramic (MLCC), 470nF, ±10%, 100V, X7R, ±10%, SMD 1206; Manufacturer: TDK; Manufacturer Part Number: C3216X7R2A474KT0L0U; Package Size: 1206; JLCPCB Basic Part: No; JLCPCB Part Number: C342806; Supplier 1: LCSC; Category: Capacitors - MLCC; Supplier Part Number 1: C342806; Tolerance: ±10%; Voltage Rating: 100V; Temperature Coefficient: X7R; RoHS: Yes; ComponentLink1Description: Datasheet; ComponentLink1URL: https://wmsc.lcsc.com/wmsc/upload/file/pdf/v2/lcsc/2304140030_TDK-C3216X7R2A474KT0L0U_C342806.pdf; ComponentLink2Description: JLCPCB Part URL; ComponentLink2URL: https://jlcpcb.com/partdetail/C342806; ComponentLink3Description: LCSC Part URL; ComponentLink3URL: https://lcsc.com/product-detail/Multilayer-Ceramic-Capacitors-MLCC---SMD-SMT_TDK-TDK-C3216X7R2A474KT0L0U_C342806.html
footprint CAP-1206 (1206 (3216M) Capacitor)
pins: 1, 2

## C3216X7R2E104KT0L0U
designator C?  Capacitance: 100nF  (hidden comment: *)
Capacitor, Ceramic (MLCC), 100nF, ±10%, 250V, X7R, ±10%, SMD 1206; Manufacturer: TDK; Manufacturer Part Number: C3216X7R2E104KT0L0U; Package Size: 1206; JLCPCB Basic Part: No; JLCPCB Part Number: C76671; Supplier 1: LCSC; Category: Capacitors - MLCC; Supplier Part Number 1: C76671; Tolerance: ±10%; Voltage Rating: 250V; Temperature Coefficient: X7R; RoHS: Yes; ComponentLink1Description: Datasheet; ComponentLink1URL: https://wmsc.lcsc.com/wmsc/upload/file/pdf/v2/lcsc/2304140030_TDK-C3216X7R2E104KT0L0U_C76671.pdf; ComponentLink2Description: JLCPCB Part URL; ComponentLink2URL: https://jlcpcb.com/partdetail/C76671; ComponentLink3Description: LCSC Part URL; ComponentLink3URL: https://lcsc.com/product-detail/Multilayer-Ceramic-Capacitors-MLCC---SMD-SMT_TDK-TDK-C3216X7R2E104KT0L0U_C76671.html
footprint CAP-1206 (1206 (3216M) Capacitor)
pins: 1, 2

## C3216X7R2E223KT020U
designator C?  Capacitance: 22nF  (hidden comment: *)
Capacitor, Ceramic (MLCC), 22nF, ±10%, 250V, X7R, ±10%, SMD 1206; Manufacturer: TDK; Manufacturer Part Number: C3216X7R2E223KT020U; Package Size: 1206; JLCPCB Basic Part: No; JLCPCB Part Number: C76672; Supplier 1: LCSC; Category: Capacitors - MLCC; Supplier Part Number 1: C76672; Tolerance: ±10%; Voltage Rating: 250V; Temperature Coefficient: X7R; RoHS: Yes; ComponentLink1Description: Datasheet; ComponentLink1URL: https://wmsc.lcsc.com/wmsc/upload/file/pdf/v2/lcsc/2304140030_TDK-C3216X7R2E223KT020U_C76672.pdf; ComponentLink2Description: JLCPCB Part URL; ComponentLink2URL: https://jlcpcb.com/partdetail/C76672; ComponentLink3Description: LCSC Part URL; ComponentLink3URL: https://lcsc.com/product-detail/Multilayer-Ceramic-Capacitors-MLCC---SMD-SMT_TDK-TDK-C3216X7R2E223KT020U_C76672.html
footprint CAP-1206 (1206 (3216M) Capacitor)
pins: 1, 2

## C3216X7R2E473KT020U
designator C?  Capacitance: 47nF  (hidden comment: *)
Capacitor, Ceramic (MLCC), 47nF, ±10%, 250V, X7R, ±10%, SMD 1206; Manufacturer: TDK; Manufacturer Part Number: C3216X7R2E473KT020U; Package Size: 1206; JLCPCB Basic Part: No; JLCPCB Part Number: C76673; Supplier 1: LCSC; Category: Capacitors - MLCC; Supplier Part Number 1: C76673; Tolerance: ±10%; Voltage Rating: 250V; Temperature Coefficient: X7R; RoHS: Yes; ComponentLink1Description: Datasheet; ComponentLink1URL: https://wmsc.lcsc.com/wmsc/upload/file/pdf/v2/lcsc/2304140030_TDK-C3216X7R2E473KT020U_C76673.pdf; ComponentLink2Description: JLCPCB Part URL; ComponentLink2URL: https://jlcpcb.com/partdetail/C76673; ComponentLink3Description: LCSC Part URL; ComponentLink3URL: https://lcsc.com/product-detail/Multilayer-Ceramic-Capacitors-MLCC---SMD-SMT_TDK-TDK-C3216X7R2E473KT020U_C76673.html
footprint CAP-1206 (1206 (3216M) Capacitor)
pins: 1, 2

## C3216X7R2E683KT0L0U
designator C?  Capacitance: 68nF  (hidden comment: *)
Capacitor, Ceramic (MLCC), 68nF, ±10%, 250V, X7R, ±10%, SMD 1206; Manufacturer: TDK; Manufacturer Part Number: C3216X7R2E683KT0L0U; Package Size: 1206; JLCPCB Basic Part: No; JLCPCB Part Number: C338040; Supplier 1: LCSC; Category: Capacitors - MLCC; Supplier Part Number 1: C338040; Tolerance: ±10%; Voltage Rating: 250V; Temperature Coefficient: X7R; RoHS: Yes; ComponentLink1Description: Datasheet; ComponentLink1URL: https://wmsc.lcsc.com/wmsc/upload/file/pdf/v2/lcsc/2304140030_TDK-C3216X7R2E683KT0L0U_C338040.pdf; ComponentLink2Description: JLCPCB Part URL; ComponentLink2URL: https://jlcpcb.com/partdetail/C338040; ComponentLink3Description: LCSC Part URL; ComponentLink3URL: https://lcsc.com/product-detail/Multilayer-Ceramic-Capacitors-MLCC---SMD-SMT_TDK-TDK-C3216X7R2E683KT0L0U_C338040.html
footprint CAP-1206 (1206 (3216M) Capacitor)
pins: 1, 2

## C3216X7R2J102KT020U
designator C?  Capacitance: 1nF  (hidden comment: *)
Capacitor, Ceramic (MLCC), 1nF, ±10%, 630V, X7R, ±10%, SMD 1206; Manufacturer: TDK; Manufacturer Part Number: C3216X7R2J102KT020U; Package Size: 1206; JLCPCB Basic Part: No; JLCPCB Part Number: C76674; Supplier 1: LCSC; Category: Capacitors - MLCC; Supplier Part Number 1: C76674; Tolerance: ±10%; Voltage Rating: 630V; Temperature Coefficient: X7R; RoHS: Yes; ComponentLink1Description: Datasheet; ComponentLink1URL: https://wmsc.lcsc.com/wmsc/upload/file/pdf/v2/lcsc/2304140030_TDK-C3216X7R2J102KT020U_C76674.pdf; ComponentLink2Description: JLCPCB Part URL; ComponentLink2URL: https://jlcpcb.com/partdetail/C76674; ComponentLink3Description: LCSC Part URL; ComponentLink3URL: https://lcsc.com/product-detail/Multilayer-Ceramic-Capacitors-MLCC---SMD-SMT_TDK-TDK-C3216X7R2J102KT020U_C76674.html
footprint CAP-1206 (1206 (3216M) Capacitor)
pins: 1, 2

## C3216X7R2J103KT020U
designator C?  Capacitance: 10nF  (hidden comment: *)
Capacitor, Ceramic (MLCC), 10nF, ±10%, 630V, X7R, ±10%, SMD 1206; Manufacturer: TDK; Manufacturer Part Number: C3216X7R2J103KT020U; Package Size: 1206; JLCPCB Basic Part: No; JLCPCB Part Number: C342866; Supplier 1: LCSC; Category: Capacitors - MLCC; Supplier Part Number 1: C342866; Tolerance: ±10%; Voltage Rating: 630V; Temperature Coefficient: X7R; RoHS: Yes; ComponentLink1Description: Datasheet; ComponentLink1URL: https://wmsc.lcsc.com/wmsc/upload/file/pdf/v2/lcsc/2304140030_TDK-C3216X7R2J103KT020U_C342866.pdf; ComponentLink2Description: JLCPCB Part URL; ComponentLink2URL: https://jlcpcb.com/partdetail/C342866; ComponentLink3Description: LCSC Part URL; ComponentLink3URL: https://lcsc.com/product-detail/Multilayer-Ceramic-Capacitors-MLCC---SMD-SMT_TDK-TDK-C3216X7R2J103KT020U_C342866.html
footprint CAP-1206 (1206 (3216M) Capacitor)
pins: 1, 2